# Altium footprint library DIP Component.PcbLib: 327 footprints (part 2 of 21)
Each footprint in its own frame and in the unit in brackets; x right, y up, seen from the top. Pads: shape width x height; smd on the part's side, far side on the other; paste and mask are expansions set on the pad; w line width, h text height; cw(c..) or ccw(c..) is an arc to the next point about the centre after c.
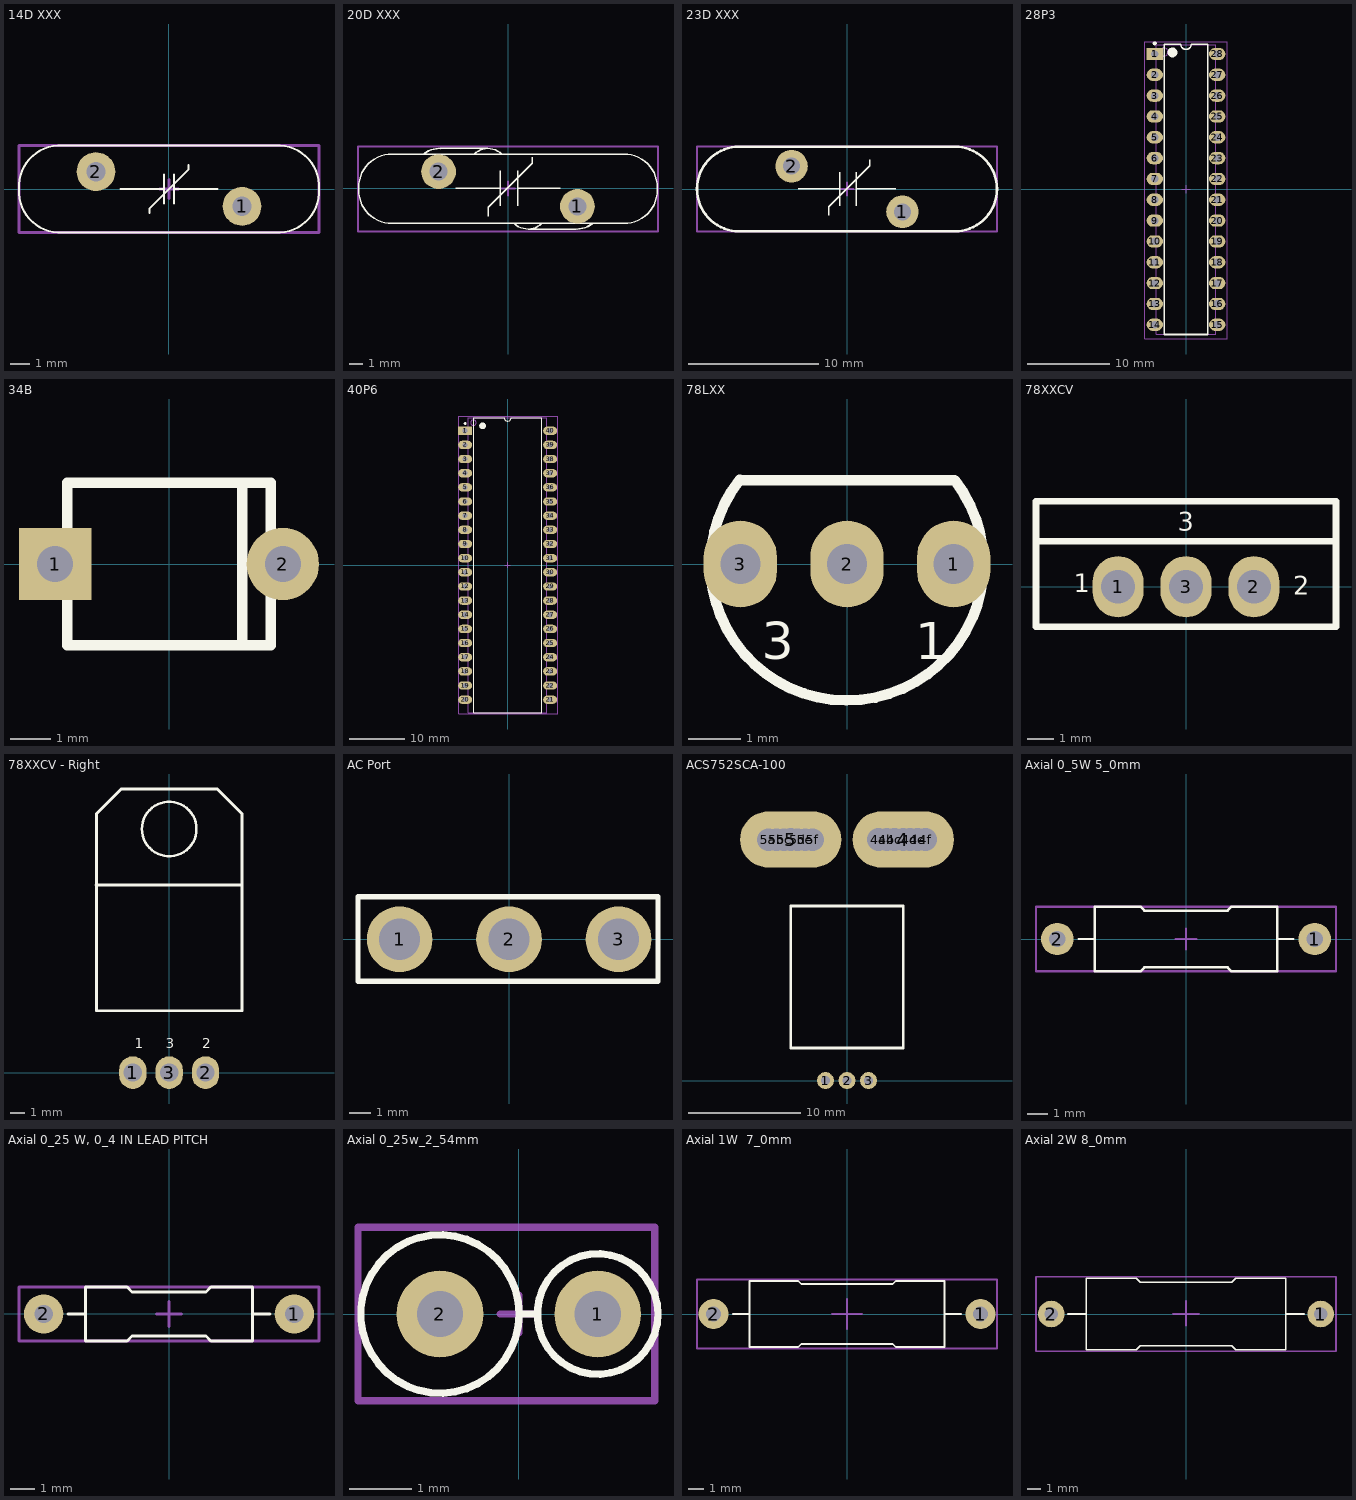
[diagram p1: the footprints below, top view; thin cyan lines are the x and y axes]

## 14D XXX [mm] "MOV-14DxxxK Metal Oxide Varistors (MOVs) are 14 mm-Design:Abbas Basereh"
height 19.5
pads (2):
  round 2 hole 1: 1(3.775,-0.9) 2(-3.775,0.9)
Top Overlay:
  lines w0.1: -2.5,0 -0.25,0 ; -1,-1.25 -1,-1 1,1 1,1.25 ; -0.25,-0.75 -0.25,0.75 ; 0.25,-0.75 0.25,0.75 ; 0.25,0 2.5,0 ; -7.75,0 ccw(c-5.625,-0.125) -5.75,-2.25 5.75,-2.25 ccw(c5.625,-0.125) 7.75,0 ccw(c5.625,0.125) 5.75,2.25 -5.75,2.25 ccw(c-5.625,0.125) -7.75,0
Mechanical 15:
  lines w0.15: -0.5,0 0.5,0 ; 0,-0.5 0,0.5 ; -7.75,-2.25 -7.75,2.25 7.75,2.25 7.75,-2.25 -7.75,-2.25
3D body "alsrobot-S14K25 MOV.STEP": height 19.5, standoff -2, extent -7.725,-2.1 7.775,2.1

## 20D XXX [mm] "MOV-20DxxxK Metal Oxide Varistors (MOVs) are 20 mm-Design:Abbas Basereh"
height 23.5
pads (2):
  round 2.5 hole 1.3: 1(5,-1.3) 2(-5,1.2)
Top Overlay:
  drawing of 162 lines, arcs and shapes, not listed
Mechanical 15:
  lines w0.15: -0.5,0 0.5,0 ; 0,-0.5 0,0.5 ; -10.8,-3.1 10.8,-3.1 10.8,3 -10.8,3 -10.8,-3.1
3D body "User Library-Varistor_20mm.STEP": height 25.5, standoff -1.99, extent -10.756,-2.898 10.744,2.9

## 23D XXX [mm] "MOV-23DxxxK Metal Oxide Varistors (MOVs) are 23 mm-Design:Abbas Basereh"
height 29.5
pads (2):
  round 2.5 hole 1.3: 1(4.25,-1.75) 2(-4.25,1.75)
Top Overlay:
  lines w0.1: -3.75,0 -0.57,0 ; -1.415,-2 -1.415,-1.365 1.75,1.8 1.75,2.25 ; -0.57,-1.27 -0.57,1.27 ; 0.7,-1.27 0.7,1.27 ; 0.7,0 3.75,0
  lines w0.2: -11.5,0 ccw(c-8.25,0) -8.25,-3.25 8.25,-3.25 ccw(c8.25,0) 11.5,0 ccw(c8.25,0) 8.25,3.25 -8.25,3.25 ccw(c-8.25,0) -11.5,0
Mechanical 15:
  lines w0.15: -0.5,0 0.5,0 ; 0,-0.5 0,0.5 ; -11.5,-3.25 -11.5,3.25 11.5,3.25 11.5,-3.25 -11.5,-3.25
3D body "User Library-V275LA40AP.STEP": height 28, standoff -2, extent -11.5,-2.8 11.5,2.8

## 28P3 [mm] "DIP, 28-Leads, Row Spacing 7.62mm, Pitch 2.54mm, Body 34.67x7.3mm"
height 4.58
pads (28):
  rect 2x1.5 hole 0.9: 1(-3.81,16.51)
  oval 2x1.5 hole 0.9: 2(-3.81,13.97) 3(-3.81,11.43) 4(-3.81,8.89) 5(-3.81,6.35) 6(-3.81,3.81) 7(-3.81,1.27) 8(-3.81,-1.27) 9(-3.81,-3.81) 10(-3.81,-6.35) 11(-3.81,-8.89) 12(-3.81,-11.43) 13(-3.81,-13.97) 14(-3.81,-16.51) 15(3.81,-16.51) 16(3.81,-13.97) 17(3.81,-11.43) 18(3.81,-8.89) 19(3.81,-6.35) 20(3.81,-3.81) 21(3.81,-1.27) 22(3.81,1.27) 23(3.81,3.81) 24(3.81,6.35) 25(3.81,8.89) 26(3.81,11.43) 27(3.81,13.97) 28(3.81,16.51)
Top Overlay:
  circle w0.6: c-1.65,16.7 r0.3
  circle w0.25: c-3.81,17.81 r0.125
  lines w0.2: -2.65,-17.7 2.65,-17.7 2.65,17.7 0.635,17.7 cw(c0,17.7) -0.635,17.7 -2.65,17.7 -2.65,-17.7
Mechanical 13:
  circle w0.1: c-2.7,16.75 r0.5
  lines w0.1: -3.6,-17.65 3.6,-17.65 3.6,17.65 -3.6,17.65 -3.6,-17.65
Mechanical 15:
  lines w0.1: -0.5,0 0.5,0 ; 0,-0.5 0,0.5 ; -5,-18.25 5,-18.25 5,18 -5,18 -5,-18.25
3D body "User Library-User Library-ATmega 48_88_168_328 28P3_90DEG.STEP": height 5.04, standoff -2.08, extent -3.953,-17.35 3.953,17.3

## 34B [mil] "Photo Diode"
pads (2):
  rect 70x70 hole 35: 1(-110.24,0)
  round 70 hole 35: 2(110.24,0)
Top Overlay:
  lines w10: 70.87,-78.74 70.87,78.74 ; -98.43,-78.74 -98.43,78.74 98.43,78.74 98.43,-78.74 -98.43,-78.74
3D body: height 111.42, standoff 95.47, extent -78.74,-66.93 78.74,66.93
3D body "BPW34B.STEP": height 112.2, standoff -99.03, extent -120.53,-78.74 120.53,78.74

## 40P6 [mm] "DIP, 40-Leads, Row Spacing 15.24mm, Pitch 2.54mm, Body 52.2x13.95mm"
height 4.83
pads (40):
  rect 2.5x1.5 hole 0.9: 1(-7.62,24.13)
  oval 2.5x1.5 hole 0.9: 2(-7.62,21.59) 3(-7.62,19.05) 4(-7.62,16.51) 5(-7.62,13.97) 6(-7.62,11.43) 7(-7.62,8.89) 8(-7.62,6.35) 9(-7.62,3.81) 10(-7.62,1.27) 11(-7.62,-1.27) 12(-7.62,-3.81) 13(-7.62,-6.35) 14(-7.62,-8.89) 15(-7.62,-11.43) 16(-7.62,-13.97) 17(-7.62,-16.51) 18(-7.62,-19.05) 19(-7.62,-21.59) 20(-7.62,-24.13) 21(7.62,-24.13) 22(7.62,-21.59) 23(7.62,-19.05) 24(7.62,-16.51) 25(7.62,-13.97) 26(7.62,-11.43) 27(7.62,-8.89) 28(7.62,-6.35) 29(7.62,-3.81) 30(7.62,-1.27) 31(7.62,1.27) 32(7.62,3.81) 33(7.62,6.35) 34(7.62,8.89) 35(7.62,11.43) 36(7.62,13.97) 37(7.62,16.51) 38(7.62,19.05) 39(7.62,21.59) 40(7.62,24.13)
Top Overlay:
  circle w0.25: c-7.62,25.43 r0.125
  circle w0.6: c-4.5,25 r0.3
  lines w0.2: -6.1,-26.5 -6.1,26.5 -0.635,26.5 ccw(c0,26.5) 0.635,26.5 6.1,26.5 6.1,-26.5 -6.1,-26.5
Mechanical 13:
  circle w0.1: c-6.15,25.575 r0.5
  lines w0.1: -7.05,-26.475 -7.05,26.475 7.05,26.475 7.05,-26.475 -7.05,-26.475
Mechanical 15:
  lines w0.1: -0.5,0 0.5,0 ; 0,-0.5 0,0.5
  lines w0.15: -8.8,-26.7 9,-26.7 9,26.7 -8.8,26.7 -8.8,-26.7
3D body "User Library-DIP40-600-with-chip-Type2.STEP": height 7.89, standoff -3.27, extent -8.7,-26.13 8.9,26.13

## 78LXX [mil]
height 236.22
pads (3):
  oval 55x65 hole 30: 1(80,0) 2(0,0) 3(-80,0)
Top Overlay:
  lines w7.87: -80.54,63.17 ccw(c0,0) 81.13,62.41 80.55,62.99 -80.31,62.99
  text "1" at 51,-71.26 h27.56
  text "3" at -64,-71.26 h27.56
3D body "SW3dPS-TO-92A.STEP": height 314.96, standoff -118.11, extent -97.49,-90.72 91.49,64

## 78XXCV [mil]
pads (3):
  oval 75x90 hole 50: 1(-100,0) 2(100,0) 3(0,0)
Top Overlay:
  lines w10: -220.73,66.93 220.73,66.93 ; -220.73,-58.86 -220.73,125.79 220.73,125.79 220.73,-58.86 -220.73,-58.86
  text "1" at -165.35,-7.87 h27.56
  text "2" at 157.48,-11.81 h27.56
  text "3" at -11.81,82.68 h27.56
3D body "SW3dPS-TO220AB.step": height 780.71, standoff -137.8, extent -220.73,-58.86 220.73,125.79
3D body "User Library-577202B00000G.step": height 889.76, standoff 139.76, extent -259.84,-342.52 260.16,157.48

## 78XXCV - Right [mil] "Right Angle"
height 177.17
pads (3):
  oval 75x90 hole 50: 1(-100,0) 2(100,0) 3(0,0)
Top Overlay:
  circle w7: c0,670 r75
  lines w7.87: -201,516.22 199,516.22 ; -200,170 -200,578.74 -200,712 -132,780 132,780 200,712 200,170 -200,170
  text "3" at -10,66.93 h27.56
  text "2" at 91,66.93 h27.56
  text "1" at -95,66.93 h27.56
3D body "78XXCV.STEP": height 175, standoff -112.5, extent -198,-8 202,776

## AC Port [mil]
pads (3):
  round 120 hole 75: 1(-200,0) 2(0,0) 3(200,0)
Top Overlay:
  lines w10: -276,-77 272,-77 272,78 -276,78 -276,-77
3D body: height 50, standoff -30, extent 170.87,-29.98 230.83,29.98
3D body: height 200, standoff 30, extent 138.87,-61.98 262.83,61.98
3D body: height 50, standoff -30, extent -29.98,-29.98 29.98,29.98
3D body: height 200, standoff 30, extent -61.98,-61.98 61.98,61.98
3D body: height 200, standoff 30, extent -261.83,-61.98 -137.87,61.98
3D body: height 50, standoff -30, extent -229.83,-29.98 -169.87,29.98

## ACS752SCA-100 [mil]
height 295.28
pads (17):
  round 59.06 hole 31.5: 1(-75.2,0) 2(0,0) 3(75.2,0)
  oval 353.63x196.63 hole 80: 4(196.85,842.52) 5(-196.85,842.52)
  round 70 hole 80: 4a(110.78,842.52) 4b(139,842.52) 4c(165.52,842.52) 4d(220.26,842.52) 4e(247,842.52) 4f(275,842.52) 5a(-275,842) 5b(-246,842) 5c(-220,842) 5d(-173,842) 5e(-146,842) 5f(-120,842)
Top Overlay:
  lines w10: -196.85,114.17 -196.85,610.24 196.85,610.24 196.85,114.17 -196.85,114.17
3D body: height 174.41, standoff 159.45, extent -85.04,-7.48 -65.35,114.17
3D body: height 174.41, standoff 159.45, extent -9.84,-7.48 9.84,114.17
3D body: height 174.41, standoff 159.45, extent 65.35,-7.48 85.04,114.17
3D body: height 159.45, standoff -118.11, extent 65.35,-7.48 85.04,7.48
3D body: height 159.45, standoff -118.11, extent -85.04,-7.48 -65.35,7.48
3D body: height 118.11, standoff -125.98, extent 116.14,811.02 277.56,874.02
3D body: height 118.11, standoff -125.98, extent -277.56,811.02 -116.14,874.02
3D body: height 177.17, standoff 118.11, extent 116.14,283.46 277.56,874.02
3D body: height 177.17, standoff 118.11, extent -277.56,283.46 -116.14,874.02
3D body: height 287.4, standoff 11.81, extent -196.85,114.17 196.85,610.24
3D body: height 159.45, standoff -118.11, extent -9.84,-7.48 9.84,7.48

## Axial 0_5W 5_0mm [mm] "Designer Abbas Basereh"
height 6
pads (2):
  round 1.6 hole 0.8: 1(6.35,0) 2(-6.35,0)
Top Overlay:
  lines w0.12: -5.3,0 -4.5,0 ; 4.5,0 5.3,0 ; -4.5,-1.6 -4.5,1.6 -2.25,1.6 -2.05,1.4 2.05,1.4 2.25,1.6 4.5,1.6 4.5,-1.6 2.25,-1.6 2.05,-1.4 -2.05,-1.4 -2.25,-1.6 -4.5,-1.6
Mechanical 15:
  lines w0.12: -0.5,0 0.5,0 ; 0,-0.5 0,0.5 ; -7.4,-1.6 -7.4,1.6 7.4,1.6 7.4,-1.6 -7.4,-1.6
3D body "User Library-Res50 0_5W SilCoat.STEP": height 4.02, standoff -1.3, extent -6.7,-1.65 6.7,1.65

## Axial 0_25 W, 0_4 IN LEAD PITCH [mm] "Designer Abbas Basereh"
height 5
pads (2):
  round 1.6 hole 0.75: 1(5.1,0) 2(-5.1,0)
Top Overlay:
  lines w0.12: -4.1,0 -3.4,0 ; 3.4,0 4.1,0 ; -3.4,-1.1 -1.7,-1.1 -1.5,-0.9 1.5,-0.9 1.7,-1.1 3.4,-1.1 3.4,1.1 1.7,1.1 1.5,0.9 -1.5,0.9 -1.7,1.1 -3.4,1.1 -3.4,-1.1
Mechanical 15:
  lines w0.12: -0.5,0 0.5,0 ; 0,-0.5 0,0.5 ; -6.1,-1.1 6.1,-1.1 6.1,1.1 -6.1,1.1 -6.1,-1.1
3D body "SW3dPS-RESISTOR, 0.25 W, 0.4 IN LEAD PITCH.STEP": height 3.63, standoff -1.84, extent -5.405,-1.156 5.365,1.156

## Axial 0_25w_2_54mm [mm] "Designer Abbas Basereh"
height 7
pads (2):
  round 1.4 hole 0.75: 1(1.275,0) 2(-1.275,0)
Top Overlay:
  circle w0.12: c1.275,0 r0.975
  circle w0.12: c-1.275,0 r1.281
  lines w0.12: 0.006,0 0.3,0
Mechanical 15:
  lines w0.12: -0.3,0 0.3,0 ; 0,-0.3 0,0.3 ; -2.6,-1.4 2.2,-1.4 2.2,1.4 -2.6,1.4 -2.6,-1.4
3D body "User Library-Resistor 0_25w_2_54mm.STEP": height 9.4, standoff -2, extent -2.475,-1.2 1.565,1.2

## Axial 1W  7_0mm [mm] "Designer Abbas Basereh"
height 7
pads (2):
  round 2 hole 1: 1(8.9,0) 2(-8.9,0)
Top Overlay:
  lines w0.12: -7.6,0 -6.5,0 ; 6.5,0 7.6,0 ; -6.5,-2.2 -6.5,2.2 -3.25,2.2 -3.05,2 3.05,2 3.25,2.2 6.5,2.2 6.5,-2.2 3.25,-2.2 3.05,-2 -3.05,-2 -3.25,-2.2 -6.5,-2.2
Mechanical 15:
  lines w0.12: -1,0 1,0 ; 0,-1 0,1 ; -10,-2.3 -10,2.3 10,2.3 10,-2.3 -10,-2.3
3D body "User Library-Res70 1W SilCoat.STEP": height 5.22, standoff -1.3, extent -9.265,-2.25 9.265,2.25

## Axial 2W 8_0mm [mm] "Designer Abbas Basereh"
height 8
pads (2):
  round 2 hole 1: 1(10.15,0) 2(-10.15,0)
Top Overlay:
  lines w0.12: -8.9,0 -7.5,0 ; 7.5,0 8.9,0 ; -7.5,-2.7 -3.75,-2.7 -3.45,-2.4 3.45,-2.4 3.75,-2.7 7.5,-2.7 7.5,2.7 3.75,2.7 3.45,2.4 -3.45,2.4 -3.75,2.7 -7.5,2.7 -7.5,-2.7
Mechanical 15:
  lines w0.12: -1,0 1,0 ; 0,-0.9 0,1 ; -11.3,-2.8 11.3,-2.8 11.3,2.8 -11.3,2.8 -11.3,-2.8
3D body "User Library-Res80 2W SilCoat.STEP": height 5.97, standoff -1.3, extent -10.565,-2.75 10.565,2.75